# Altium footprint library Package_SO.PcbLib: 333 footprints (part 2 of 21)
Each footprint in its own frame and in the unit in brackets; x right, y up, seen from the top. Pads: shape width x height; smd on the part's side, far side on the other; paste and mask are expansions set on the pad; w line width, h text height; cw(c..) or ccw(c..) is an arc to the next point about the centre after c.
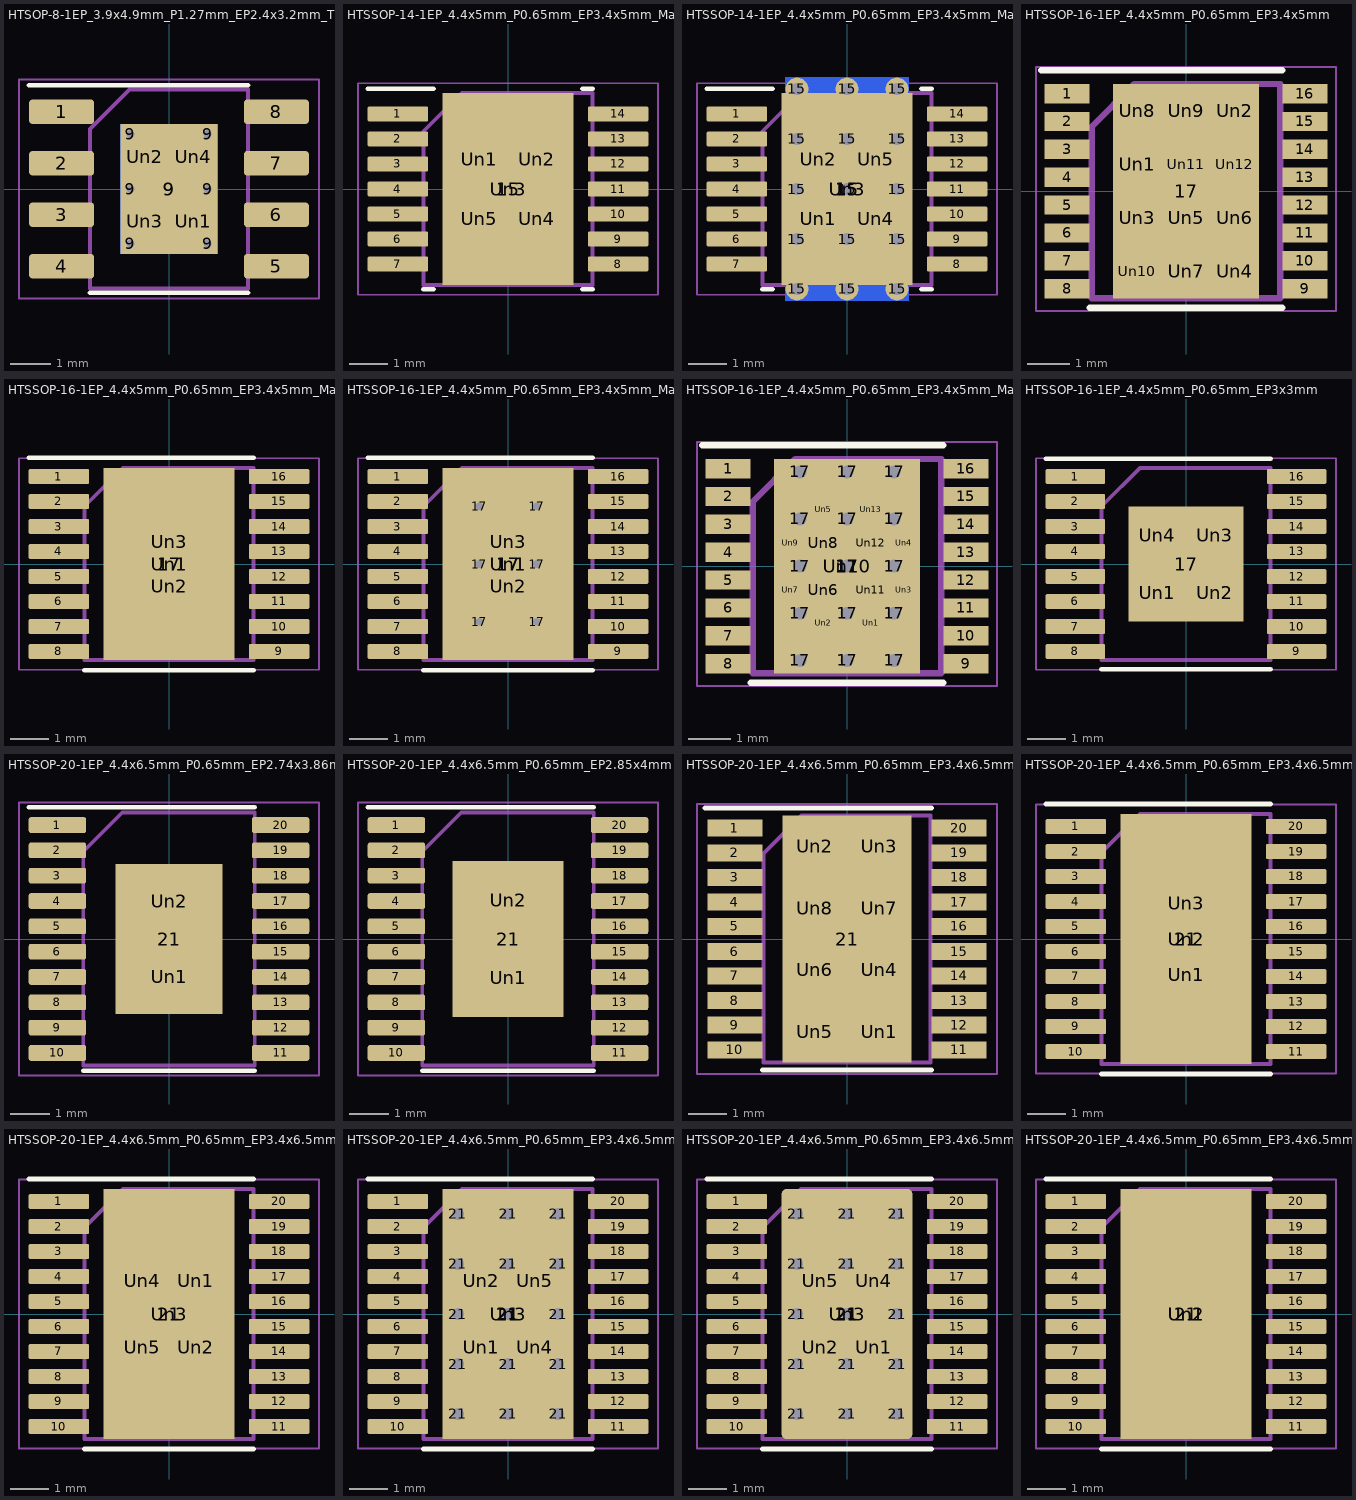
[diagram p1: the footprints below, top view; thin cyan lines are the x and y axes]

## HTSOP-8-1EP_3.9x4.9mm_P1.27mm_EP2.4x3.2mm_ThermalVias [mm]
pads (20):
  rrect25% 1.6x0.6 smd: 1(-2.65,1.905) 2(-2.65,0.635) 3(-2.65,-0.635) 4(-2.65,-1.905) 5(2.65,-1.905) 6(2.65,-0.635) 7(2.65,0.635) 8(2.65,1.905)
  round 0.5 hole 0.2: 9(-0.95,-1.35) 9(-0.95,0) 9(-0.95,1.35) 9(0.95,-1.35) 9(0.95,0) 9(0.95,1.35)
  rect 2.4x3.2 smd: 9(0,0)
  rect 2.4x3.2 smd far side: 9(0,0)
  rrect25% 0.97x1.29 on Top Paste: Un1(0.6,-0.8) Un2(-0.6,0.8) Un3(-0.6,-0.8) Un4(0.6,0.8)
F.SilkS:
  lines w0.12: -3.45,2.56 0,2.56 1.95,2.56 ; -1.95,-2.56 0,-2.56 1.95,-2.56
F.CrtYd:
  lines w0.05: -3.7,-2.7 3.7,-2.7 3.7,2.7 -3.7,2.7 -3.7,-2.7
F.Fab:
  lines w0.1: -1.95,-2.45 -1.95,1.475 -0.975,2.45 1.95,2.45 1.95,-2.45 -1.95,-2.45
  text "'.Designator'" at -3.819,-0.35 h0.98

## HTSSOP-14-1EP_4.4x5mm_P0.65mm_EP3.4x5mm_Mask3x3.1mm [mm]
pads (20):
  rrect25% 1.575x0.4 smd: 1(-2.863,1.95) 2(-2.863,1.3) 3(-2.863,0.65) 4(-2.863,0) 5(-2.863,-0.65) 6(-2.863,-1.3) 7(-2.863,-1.95) 8(2.863,-1.95) 9(2.863,-1.3) 10(2.863,-0.65) 11(2.863,0) 12(2.863,0.65) 13(2.863,1.3) 14(2.863,1.95)
  rect 3.4x5 smd: 15(0,0)
  rrect21% 1.21x1.25 on Top Paste: Un1(-0.75,0.775) Un2(0.75,0.775) Un4(0.75,-0.775) Un5(-0.75,-0.775)
  rect 3x3.1 on Top Solder: Un3(0,0)
F.SilkS:
  lines w0.12: -3.65,2.61 -1.936,2.61 ; -2.2,-2.61 -1.936,-2.61 ; 1.936,-2.61 2.2,-2.61 ; 1.936,2.61 2.2,2.61
F.CrtYd:
  lines w0.05: -3.9,-2.75 -3.9,2.75 3.9,2.75 3.9,-2.75 -3.9,-2.75
F.Fab:
  lines w0.1: -2.2,-2.5 -2.2,1.5 -1.2,2.5 2.2,2.5 2.2,-2.5 -2.2,-2.5
  text "'.Designator'" at -3.897,-0.357 h1

## HTSSOP-14-1EP_4.4x5mm_P0.65mm_EP3.4x5mm_Mask3x3.1mm_ThermalVias [mm]
pads (36):
  rrect25% 1.575x0.4 smd: 1(-2.863,1.95) 2(-2.863,1.3) 3(-2.863,0.65) 4(-2.863,0) 5(-2.863,-0.65) 6(-2.863,-1.3) 7(-2.863,-1.95) 8(2.863,-1.95) 9(2.863,-1.3) 10(2.863,-0.65) 11(2.863,0) 12(2.863,0.65) 13(2.863,1.3) 14(2.863,1.95)
  round 0.6 hole 0.3: 15(-1.3,-2.6) 15(-1.3,-1.3) 15(-1.3,0) 15(-1.3,1.3) 15(-1.3,2.6) 15(0,-2.6) 15(0,-1.3) 15(0,0) 15(0,1.3) 15(0,2.6) 15(1.3,-2.6) 15(1.3,-1.3) 15(1.3,0) 15(1.3,1.3) 15(1.3,2.6)
  rect 3.4x5 smd: 15(0,0)
  rect 3.2x5.8 smd far side: 15(0,0)
  rrect21% 1.21x1.25 on Top Paste: Un1(-0.75,-0.775) Un2(-0.75,0.775) Un4(0.75,-0.775) Un5(0.75,0.775)
  rect 3x3.1 on Top Solder: Un3(0,0)
F.SilkS:
  lines w0.12: -3.65,2.61 -1.936,2.61 ; -2.2,-2.61 -1.936,-2.61 ; 1.936,-2.61 2.2,-2.61 ; 1.936,2.61 2.2,2.61
F.CrtYd:
  lines w0.05: -3.9,-2.75 -3.9,2.75 3.9,2.75 3.9,-2.75 -3.9,-2.75
F.Fab:
  lines w0.1: -2.2,-2.5 -2.2,1.5 -1.2,2.5 2.2,2.5 2.2,-2.5 -2.2,-2.5
  text "'.Designator'" at -3.897,-0.357 h1

## HTSSOP-16-1EP_4.4x5mm_P0.65mm_EP3.4x5mm [mm]
pads (29):
  rect 1.05x0.45 smd: 1(-2.775,2.275) 2(-2.775,1.625) 3(-2.775,0.975) 4(-2.775,0.325) 5(-2.775,-0.325) 6(-2.775,-0.975) 7(-2.775,-1.625) 8(-2.775,-2.275) 9(2.775,-2.275) 10(2.775,-1.625) 11(2.775,-0.975) 12(2.775,-0.325) 13(2.775,0.325) 14(2.775,0.975) 15(2.775,1.625) 16(2.775,2.275)
  rect 3.4x5 smd: 17(0,0)
  rect 0.88x1.05 on Top Paste: Un1(-1.133,0.625) Un2(1.133,1.875) Un3(-1.133,-0.625) Un4(1.133,-1.875) Un5(0,-0.625) Un6(1.133,-0.625) Un7(0,-1.875) Un8(-1.133,1.875) Un9(0,1.875) Un10(-1.133,-1.875) Un11(0,0.625) Un12(1.133,0.625)
F.SilkS:
  lines w0.15: -3.375,2.825 2.25,2.825 ; -2.25,-2.725 2.25,-2.725
F.CrtYd:
  lines w0.05: -3.5,-2.8 -3.5,2.9 3.5,2.9 3.5,-2.8 -3.5,-2.8
F.Fab:
  lines w0.15: -2.2,-2.5 2.2,-2.5 2.2,2.5 -1.2,2.5 -2.2,1.5 -2.2,-2.5
  text "'.Designator'" at -3.897,-0.357 h1

## HTSSOP-16-1EP_4.4x5mm_P0.65mm_EP3.4x5mm_Mask2.46x2.31mm [mm]
pads (20):
  rrect25% 1.575x0.4 smd: 1(-2.863,2.275) 2(-2.863,1.625) 3(-2.863,0.975) 4(-2.863,0.325) 5(-2.863,-0.325) 6(-2.863,-0.975) 7(-2.863,-1.625) 8(-2.863,-2.275) 9(2.863,-2.275) 10(2.863,-1.625) 11(2.863,-0.975) 12(2.863,-0.325) 13(2.863,0.325) 14(2.863,0.975) 15(2.863,1.625) 16(2.863,2.275)
  rect 3.4x5 smd: 17(0,0)
  rect 2.46x2.31 on Top Solder: Un1(0,0)
  rrect25% 1.98x0.93 on Top Paste: Un2(0,-0.58) Un3(0,0.58)
F.SilkS:
  lines w0.12: -3.65,2.76 0,2.76 2.2,2.76 ; -2.2,-2.76 0,-2.76 2.2,-2.76
F.CrtYd:
  lines w0.05: -3.9,-2.75 -3.9,2.75 3.9,2.75 3.9,-2.75 -3.9,-2.75
F.Fab:
  lines w0.1: -2.2,-2.5 2.2,-2.5 2.2,2.5 -1.2,2.5 -2.2,1.5 -2.2,-2.5
  text "'.Designator'" at -3.897,-0.357 h1

## HTSSOP-16-1EP_4.4x5mm_P0.65mm_EP3.4x5mm_Mask2.46x2.31mm_ThermalVias [mm]
pads (27):
  rrect25% 1.575x0.4 smd: 1(-2.863,2.275) 2(-2.863,1.625) 3(-2.863,0.975) 4(-2.863,0.325) 5(-2.863,-0.325) 6(-2.863,-0.975) 7(-2.863,-1.625) 8(-2.863,-2.275) 9(2.863,-2.275) 10(2.863,-1.625) 11(2.863,-0.975) 12(2.863,-0.325) 13(2.863,0.325) 14(2.863,0.975) 15(2.863,1.625) 16(2.863,2.275)
  round 0.5 hole 0.2: 17(-0.75,-1.5) 17(-0.75,0) 17(-0.75,1.5) 17(0.75,-1.5) 17(0.75,0) 17(0.75,1.5)
  rect 3.4x5 smd: 17(0,0)
  rect 2x3.5 smd far side: 17(0,0)
  rect 2.46x2.31 on Top Solder: Un1(0,0)
  rrect25% 1.98x0.93 on Top Paste: Un2(0,-0.58) Un3(0,0.58)
F.SilkS:
  lines w0.12: -3.65,2.76 0,2.76 2.2,2.76 ; -2.2,-2.76 0,-2.76 2.2,-2.76
F.CrtYd:
  lines w0.05: -3.9,-2.75 -3.9,2.75 3.9,2.75 3.9,-2.75 -3.9,-2.75
F.Fab:
  lines w0.1: -2.2,-2.5 2.2,-2.5 2.2,2.5 -1.2,2.5 -2.2,1.5 -2.2,-2.5
  text "'.Designator'" at -3.897,-0.357 h1

## HTSSOP-16-1EP_4.4x5mm_P0.65mm_EP3.4x5mm_Mask3x3mm_ThermalVias [mm]
pads (46):
  rect 1.05x0.45 smd: 1(-2.775,2.275) 2(-2.775,1.625) 3(-2.775,0.975) 4(-2.775,0.325) 5(-2.775,-0.325) 6(-2.775,-0.975) 7(-2.775,-1.625) 8(-2.775,-2.275) 9(2.775,-2.275) 10(2.775,-1.625) 11(2.775,-0.975) 12(2.775,-0.325) 13(2.775,0.325) 14(2.775,0.975) 15(2.775,1.625) 16(2.775,2.275)
  round 0.6 hole 0.3: 17(-1.1,-2.2) 17(-1.1,-1.1) 17(-1.1,0) 17(-1.1,1.1) 17(-1.1,2.2) 17(0,-2.2) 17(0,-1.1) 17(0,0) 17(0,1.1) 17(0,2.2) 17(1.1,-2.2) 17(1.1,-1.1) 17(1.1,0) 17(1.1,1.1) 17(1.1,2.2)
  rect 3.4x5 smd: 17(0,0)
  rect 3.4x5 smd far side: 17(0,0)
  rect 0.8x0.25 on Top Paste: Un1(0.55,-1.325) Un2(-0.55,-1.325) Un5(-0.55,1.325) Un13(0.55,1.325)
  rect 0.25x0.8 on Top Paste: Un3(1.325,-0.55) Un4(1.325,0.55) Un7(-1.325,-0.55) Un9(-1.325,0.55)
  rect 0.85x0.85 on Top Paste: Un6(-0.55,-0.55) Un11(0.55,-0.55) Un12(0.55,0.55)
  rect 0.85x0.8 on Top Paste: Un8(-0.55,0.55)
  rect 3x3 on Top Solder: Un10(0,0)
F.SilkS:
  lines w0.15: -3.375,2.825 2.25,2.825 ; -2.25,-2.725 2.25,-2.725
F.CrtYd:
  lines w0.05: -3.5,-2.8 -3.5,2.9 3.5,2.9 3.5,-2.8 -3.5,-2.8
F.Fab:
  lines w0.15: -2.2,-2.5 2.2,-2.5 2.2,2.5 -1.2,2.5 -2.2,1.5 -2.2,-2.5
  text "'.Designator'" at -3.897,-0.357 h1

## HTSSOP-16-1EP_4.4x5mm_P0.65mm_EP3x3mm [mm]
pads (21):
  rrect25% 1.55x0.4 smd: 1(-2.875,2.275) 2(-2.875,1.625) 3(-2.875,0.975) 4(-2.875,0.325) 5(-2.875,-0.325) 6(-2.875,-0.975) 7(-2.875,-1.625) 8(-2.875,-2.275) 9(2.875,-2.275) 10(2.875,-1.625) 11(2.875,-0.975) 12(2.875,-0.325) 13(2.875,0.325) 14(2.875,0.975) 15(2.875,1.625) 16(2.875,2.275)
  rect 3x3 smd: 17(0,0)
  rrect21% 1.21x1.21 on Top Paste: Un1(-0.75,-0.75) Un2(0.75,-0.75) Un3(0.75,0.75) Un4(-0.75,0.75)
F.SilkS:
  lines w0.12: -3.65,2.735 0,2.735 2.2,2.735 ; -2.2,-2.735 0,-2.735 2.2,-2.735
F.CrtYd:
  lines w0.05: -3.9,-2.75 3.9,-2.75 3.9,2.75 -3.9,2.75 -3.9,-2.75
F.Fab:
  lines w0.1: -2.2,-2.5 -2.2,1.5 -1.2,2.5 2.2,2.5 2.2,-2.5 -2.2,-2.5
  text "'.Designator'" at -4.047,-0.84 h1

## HTSSOP-20-1EP_4.4x6.5mm_P0.65mm_EP2.74x3.86mm [mm]
pads (23):
  rrect25% 1.475x0.4 smd: 1(-2.863,2.925) 2(-2.863,2.275) 3(-2.863,1.625) 4(-2.863,0.975) 5(-2.863,0.325) 6(-2.863,-0.325) 7(-2.863,-0.975) 8(-2.863,-1.625) 9(-2.863,-2.275) 10(-2.863,-2.925) 11(2.863,-2.925) 12(2.863,-2.275) 13(2.863,-1.625) 14(2.863,-0.975) 15(2.863,-0.325) 16(2.863,0.325) 17(2.863,0.975) 18(2.863,1.625) 19(2.863,2.275) 20(2.863,2.925)
  rect 2.74x3.86 smd: 21(0,0)
  rrect16% 2.21x1.56 on Top Paste: Un1(0,-0.965) Un2(0,0.965)
F.SilkS:
  lines w0.12: -3.6,3.385 0,3.385 2.2,3.385 ; -2.2,-3.385 0,-3.385 2.2,-3.385
F.CrtYd:
  lines w0.05: -3.85,-3.5 3.85,-3.5 3.85,3.5 -3.85,3.5 -3.85,-3.5
F.Fab:
  lines w0.1: -2.2,-3.25 2.2,-3.25 2.2,3.25 -1.2,3.25 -2.2,2.25 -2.2,-3.25
  text "'.Designator'" at -4.047,-0.84 h1

## HTSSOP-20-1EP_4.4x6.5mm_P0.65mm_EP2.85x4mm [mm]
pads (23):
  rrect25% 1.475x0.4 smd: 1(-2.863,2.925) 2(-2.863,2.275) 3(-2.863,1.625) 4(-2.863,0.975) 5(-2.863,0.325) 6(-2.863,-0.325) 7(-2.863,-0.975) 8(-2.863,-1.625) 9(-2.863,-2.275) 10(-2.863,-2.925) 11(2.863,-2.925) 12(2.863,-2.275) 13(2.863,-1.625) 14(2.863,-0.975) 15(2.863,-0.325) 16(2.863,0.325) 17(2.863,0.975) 18(2.863,1.625) 19(2.863,2.275) 20(2.863,2.925)
  rect 2.85x4 smd: 21(0,0)
  rrect16% 2.3x1.61 on Top Paste: Un1(0,-1) Un2(0,1)
F.SilkS:
  lines w0.12: -3.6,3.385 0,3.385 2.2,3.385 ; -2.2,-3.385 0,-3.385 2.2,-3.385
F.CrtYd:
  lines w0.05: -3.85,-3.5 -3.85,3.5 3.85,3.5 3.85,-3.5 -3.85,-3.5
F.Fab:
  lines w0.1: -2.2,-3.25 -2.2,2.25 -1.2,3.25 2.2,3.25 2.2,-3.25 -2.2,-3.25
  text "'.Designator'" at -4.047,-0.84 h1

## HTSSOP-20-1EP_4.4x6.5mm_P0.65mm_EP3.4x6.5mm [mm]
pads (29):
  rect 1.45x0.45 smd: 1(-2.95,2.92) 2(-2.95,2.27) 3(-2.95,1.62) 4(-2.95,0.97) 5(-2.95,0.33) 6(-2.95,-0.33) 7(-2.95,-0.97) 8(-2.95,-1.62) 9(-2.95,-2.27) 10(-2.95,-2.92) 11(2.95,-2.92) 12(2.95,-2.27) 13(2.95,-1.62) 14(2.95,-0.97) 15(2.95,-0.33) 16(2.95,0.33) 17(2.95,0.97) 18(2.95,1.62) 19(2.95,2.27) 20(2.95,2.92)
  rect 3.4x6.5 smd: 21(0,0)
  rect 1.4x1.325 on Top Paste: Un1(0.85,-2.438) Un2(-0.85,2.438) Un3(0.85,2.438) Un4(0.85,-0.813) Un5(-0.85,-2.438) Un6(-0.85,-0.813) Un7(0.85,0.813) Un8(-0.85,0.813)
F.SilkS:
  lines w0.12: -3.75,3.45 2.23,3.45 ; -2.23,-3.45 2.23,-3.45
F.CrtYd:
  lines w0.05: -3.95,-3.55 3.95,-3.55 3.95,3.55 -3.95,3.55 -3.95,-3.55
F.Fab:
  lines w0.1: -2.2,-3.25 2.2,-3.25 2.2,3.25 -1.2,3.25 -2.2,2.25 -2.2,-3.25
  text "'.Designator'" at -3.267,-0.702 h0.8

## HTSSOP-20-1EP_4.4x6.5mm_P0.65mm_EP3.4x6.5mm_Mask2.4x3.7mm [mm]
pads (24):
  rrect25% 1.575x0.4 smd: 1(-2.863,2.925) 2(-2.863,2.275) 3(-2.863,1.625) 4(-2.863,0.975) 5(-2.863,0.325) 6(-2.863,-0.325) 7(-2.863,-0.975) 8(-2.863,-1.625) 9(-2.863,-2.275) 10(-2.863,-2.925) 11(2.863,-2.925) 12(2.863,-2.275) 13(2.863,-1.625) 14(2.863,-0.975) 15(2.863,-0.325) 16(2.863,0.325) 17(2.863,0.975) 18(2.863,1.625) 19(2.863,2.275) 20(2.863,2.925)
  rect 3.4x6.5 smd: 21(0,0)
  rrect17% 1.93x1.49 on Top Paste: Un1(0,-0.925) Un3(0,0.925)
  rect 2.4x3.7 on Top Solder: Un2(0,0)
F.SilkS:
  lines w0.12: -3.65,3.51 0,3.51 2.2,3.51 ; -2.2,-3.51 0,-3.51 2.2,-3.51
F.CrtYd:
  lines w0.05: -3.9,-3.5 3.9,-3.5 3.9,3.5 -3.9,3.5 -3.9,-3.5
F.Fab:
  lines w0.1: -2.2,-3.25 -2.2,2.25 -1.2,3.25 2.2,3.25 2.2,-3.25 -2.2,-3.25
  text "'.Designator'" at -4.047,-0.84 h1

## HTSSOP-20-1EP_4.4x6.5mm_P0.65mm_EP3.4x6.5mm_Mask2.75x3.43mm [mm]
pads (26):
  rrect25% 1.575x0.4 smd: 1(-2.863,2.925) 2(-2.863,2.275) 3(-2.863,1.625) 4(-2.863,0.975) 5(-2.863,0.325) 6(-2.863,-0.325) 7(-2.863,-0.975) 8(-2.863,-1.625) 9(-2.863,-2.275) 10(-2.863,-2.925) 11(2.863,-2.925) 12(2.863,-2.275) 13(2.863,-1.625) 14(2.863,-0.975) 15(2.863,-0.325) 16(2.863,0.325) 17(2.863,0.975) 18(2.863,1.625) 19(2.863,2.275) 20(2.863,2.925)
  rect 3.4x6.5 smd: 21(0,0)
  rrect23% 1.11x1.38 on Top Paste: Un1(0.69,0.86) Un2(0.69,-0.86) Un4(-0.69,0.86) Un5(-0.69,-0.86)
  rect 2.75x3.43 on Top Solder: Un3(0,0)
F.SilkS:
  lines w0.12: -3.65,3.51 0,3.51 2.2,3.51 ; -2.2,-3.51 0,-3.51 2.2,-3.51
F.CrtYd:
  lines w0.05: -3.9,-3.5 3.9,-3.5 3.9,3.5 -3.9,3.5 -3.9,-3.5
F.Fab:
  lines w0.1: -2.2,-3.25 -2.2,2.25 -1.2,3.25 2.2,3.25 2.2,-3.25 -2.2,-3.25
  text "'.Designator'" at -4.047,-0.84 h1

## HTSSOP-20-1EP_4.4x6.5mm_P0.65mm_EP3.4x6.5mm_Mask2.75x3.43mm_ThermalVias [mm]
pads (42):
  rrect25% 1.575x0.4 smd: 1(-2.863,2.925) 2(-2.863,2.275) 3(-2.863,1.625) 4(-2.863,0.975) 5(-2.863,0.325) 6(-2.863,-0.325) 7(-2.863,-0.975) 8(-2.863,-1.625) 9(-2.863,-2.275) 10(-2.863,-2.925) 11(2.863,-2.925) 12(2.863,-2.275) 13(2.863,-1.625) 14(2.863,-0.975) 15(2.863,-0.325) 16(2.863,0.325) 17(2.863,0.975) 18(2.863,1.625) 19(2.863,2.275) 20(2.863,2.925)
  round 0.6 hole 0.3: 21(-1.3,-2.6) 21(-1.3,-1.3) 21(-1.3,0) 21(-1.3,1.3) 21(-1.3,2.6) 21(0,-2.6) 21(0,-1.3) 21(0,0) 21(0,1.3) 21(0,2.6) 21(1.3,-2.6) 21(1.3,-1.3) 21(1.3,0) 21(1.3,1.3) 21(1.3,2.6)
  rect 3.2x5.8 smd far side: 21(0,0)
  rect 3.4x6.5 smd: 21(0,0)
  rrect23% 1.11x1.38 on Top Paste: Un1(-0.69,-0.86) Un2(-0.69,0.86) Un4(0.69,-0.86) Un5(0.69,0.86)
  rect 2.75x3.43 on Top Solder: Un3(0,0)
F.SilkS:
  lines w0.12: -3.65,3.51 0,3.51 2.2,3.51 ; -2.2,-3.51 0,-3.51 2.2,-3.51
F.CrtYd:
  lines w0.05: -3.9,-3.5 -3.9,3.5 3.9,3.5 3.9,-3.5 -3.9,-3.5
F.Fab:
  lines w0.1: -2.2,-3.25 2.2,-3.25 2.2,3.25 -1.2,3.25 -2.2,2.25 -2.2,-3.25
  text "'.Designator'" at -4.047,-0.84 h1

## HTSSOP-20-1EP_4.4x6.5mm_P0.65mm_EP3.4x6.5mm_Mask2.75x3.43mm_ThermalVias_HandSolder [mm]
pads (42):
  rrect25% 1.575x0.4 smd: 1(-2.863,2.925) 2(-2.863,2.275) 3(-2.863,1.625) 4(-2.863,0.975) 5(-2.863,0.325) 6(-2.863,-0.325) 7(-2.863,-0.975) 8(-2.863,-1.625) 9(-2.863,-2.275) 10(-2.863,-2.925) 11(2.863,-2.925) 12(2.863,-2.275) 13(2.863,-1.625) 14(2.863,-0.975) 15(2.863,-0.325) 16(2.863,0.325) 17(2.863,0.975) 18(2.863,1.625) 19(2.863,2.275) 20(2.863,2.925)
  round 0.6 hole 0.3: 21(-1.3,-2.6) 21(-1.3,-1.3) 21(-1.3,0) 21(-1.3,1.3) 21(-1.3,2.6) 21(0,-2.6) 21(0,-1.3) 21(0,0) 21(0,1.3) 21(0,2.6) 21(1.3,-2.6) 21(1.3,-1.3) 21(1.3,0) 21(1.3,1.3) 21(1.3,2.6)
  rrect8% 3.2x5.8 smd far side: 21(0,0)
  rrect7% 3.4x6.5 smd: 21(0,0)
  rrect23% 1.11x1.38 on Top Paste: Un1(0.69,-0.86) Un2(-0.69,-0.86) Un4(0.69,0.86) Un5(-0.69,0.86)
  rrect9% 2.75x3.43 on Bottom Solder: Un3(0,0)
F.SilkS:
  lines w0.12: -3.65,3.51 0,3.51 2.2,3.51 ; -2.2,-3.51 0,-3.51 2.2,-3.51
F.CrtYd:
  lines w0.05: -3.9,-3.5 3.9,-3.5 3.9,3.5 -3.9,3.5 -3.9,-3.5
F.Fab:
  lines w0.1: -2.2,-3.25 -2.2,2.25 -1.2,3.25 2.2,3.25 2.2,-3.25 -2.2,-3.25
  text "'.Designator'" at -4.047,-0.84 h1

## HTSSOP-20-1EP_4.4x6.5mm_P0.65mm_EP3.4x6.5mm_Mask2.96x2.96mm [mm]
pads (23):
  rrect25% 1.575x0.4 smd: 1(-2.863,2.925) 2(-2.863,2.275) 3(-2.863,1.625) 4(-2.863,0.975) 5(-2.863,0.325) 6(-2.863,-0.325) 7(-2.863,-0.975) 8(-2.863,-1.625) 9(-2.863,-2.275) 10(-2.863,-2.925) 11(2.863,-2.925) 12(2.863,-2.275) 13(2.863,-1.625) 14(2.863,-0.975) 15(2.863,-0.325) 16(2.863,0.325) 17(2.863,0.975) 18(2.863,1.625) 19(2.863,2.275) 20(2.863,2.925)
  rect 3.4x6.5 smd: 21(0,0)
  rect 2.96x2.96 on Top Solder: Un1(0,0)
  rrect10% 2.39x2.39 on Top Paste: Un2(0,0)
F.SilkS:
  lines w0.12: -3.65,3.51 0,3.51 2.2,3.51 ; -2.2,-3.51 0,-3.51 2.2,-3.51
F.CrtYd:
  lines w0.05: -3.9,-3.5 3.9,-3.5 3.9,3.5 -3.9,3.5 -3.9,-3.5
F.Fab:
  lines w0.1: -2.2,-3.25 2.2,-3.25 2.2,3.25 -1.2,3.25 -2.2,2.25 -2.2,-3.25
  text "'.Designator'" at -4.047,-0.84 h1